# Altium footprint library FootprintsOld.PcbLib: 93 footprints (part 2 of 6)
Each footprint in its own frame and in the unit in brackets; x right, y up, seen from the top. Pads: shape width x height; smd on the part's side, far side on the other; paste and mask are expansions set on the pad; w line width, h text height; cw(c..) or ccw(c..) is an arc to the next point about the centre after c.
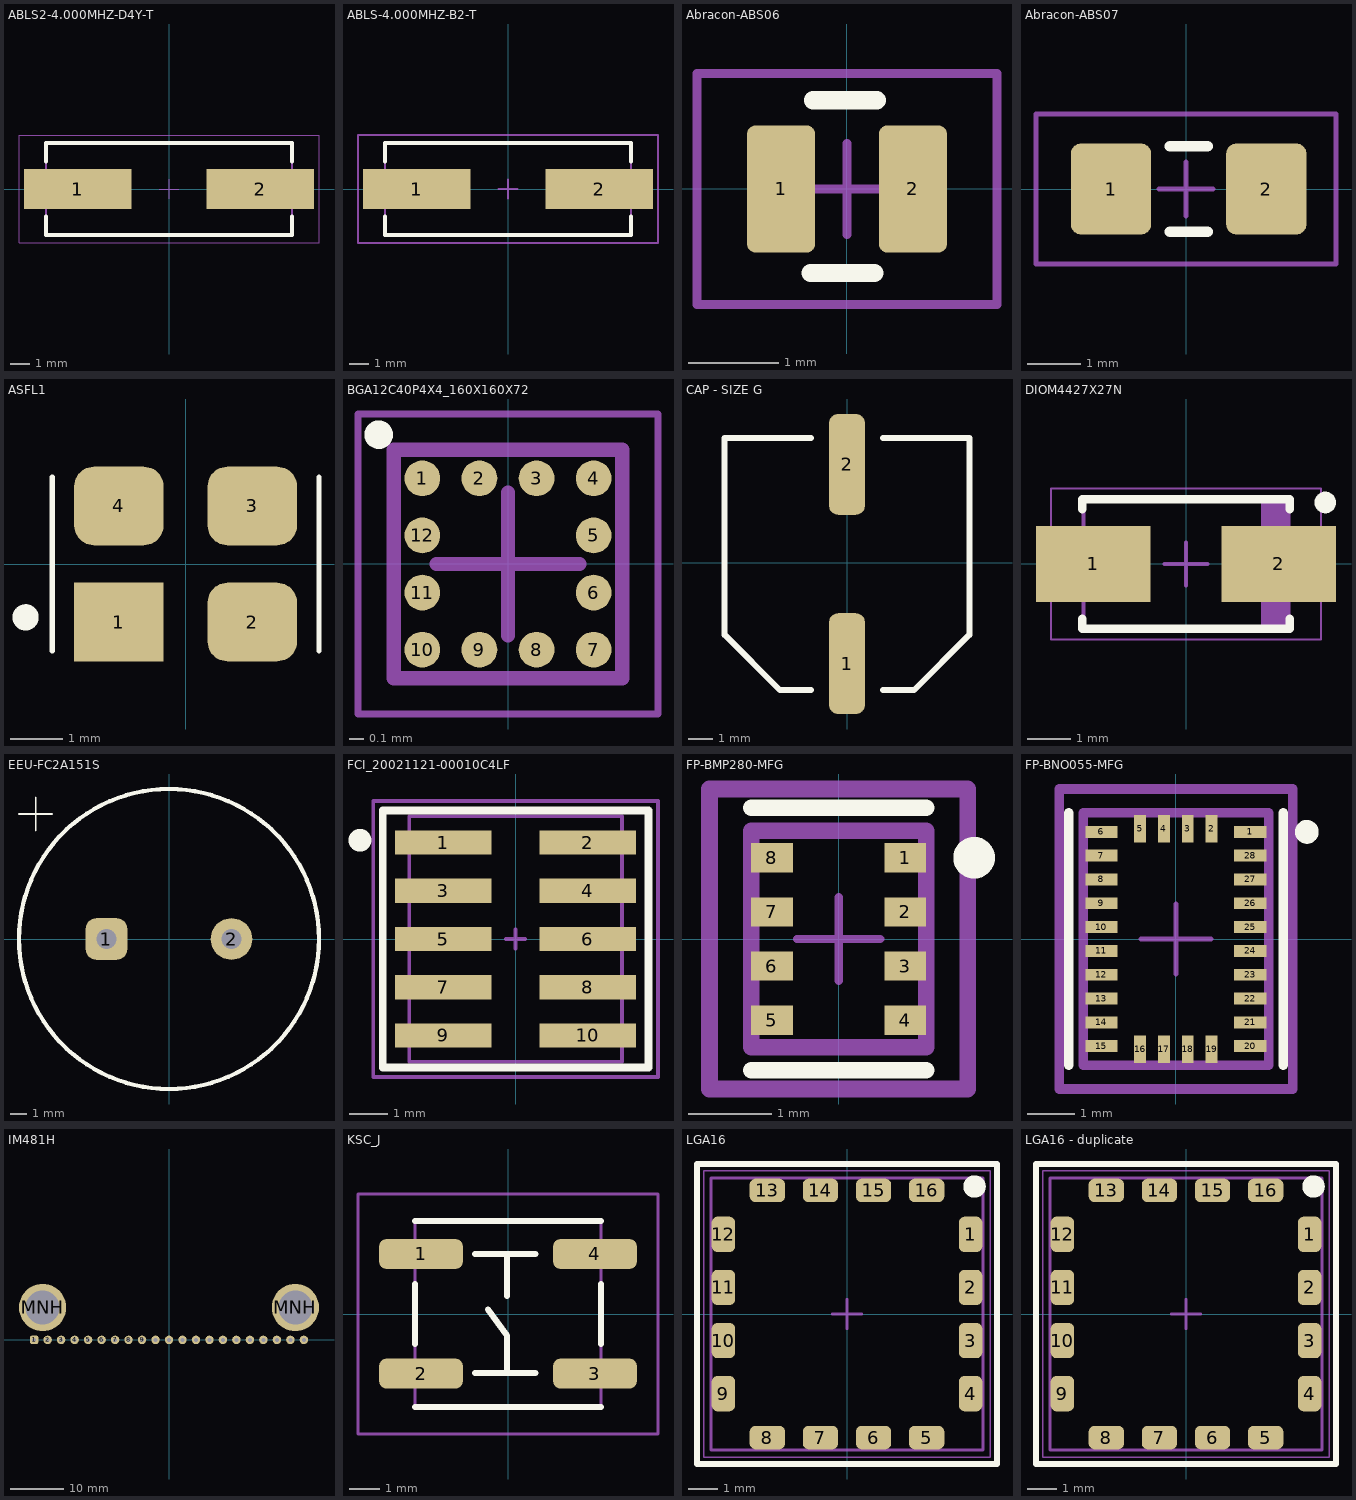
[diagram p1: the footprints below, top view; thin cyan lines are the x and y axes]

## ABLS2-4.000MHZ-D4Y-T [mm]
pads (2):
  rect 5.6x2.1 smd: 1(-4.75,0) 2(4.75,0)
Top Overlay:
  lines w0.2: -6.4,-1.425 -6.4,-2.4 6.4,-2.4 6.4,-1.425 ; -6.4,1.425 -6.4,2.4 6.4,2.4 6.4,1.425
Top Assembly (Mech13):
  lines w0.1: -6.4,-2.4 -6.4,2.4 6.4,2.4 6.4,-2.4 -6.4,-2.4
Top Courtyard:
  lines w0.05: -0.5,0 0.5,0 ; 0,-0.5 0,0.5 ; -7.8,-2.8 -7.8,2.8 7.8,2.8 7.8,-2.8 -7.8,-2.8
3D body "ABLS2.STEP": height 3.28, standoff 0.01, extent -6.35,-2.349 6.35,2.349

## ABLS-4.000MHZ-B2-T [mm]
pads (2):
  rect 5.6x2.1 smd: 1(-4.75,0) 2(4.75,0)
Top Overlay:
  lines w0.2: -6.4,-1.425 -6.4,-2.4 6.4,-2.4 6.4,-1.425 ; -6.4,1.425 -6.4,2.4 6.4,2.4 6.4,1.425
Top Assembly (Mech13):
  lines w0.1: -6.4,-2.4 6.4,-2.4 6.4,2.4 -6.4,2.4 -6.4,-2.4
Top Courtyard:
  lines w0.1: -0.5,0 0.5,0 ; 0,-0.5 0,0.5 ; -7.8,-2.8 7.8,-2.8 7.8,2.8 -7.8,2.8 -7.8,-2.8
3D body "ABLS-4.000MHZ-B2-T--3DModel-STEP-56544.STEP": height 4.08, standoff -0.15, extent -6.351,-2.413 6.4,2.413

## Abracon-ABS06 [mm] "Chip Inductor, 2-Leads, Body 3,2x1,5mm, IPC Low Density"
height 0.9
pads (2):
  rrect25% 0.75x1.4 smd: 1(-0.725,0) 2(0.725,0)
Top Overlay:
  lines w0.2: -0.4,-0.925 0.3,-0.925 ; -0.373,0.976 0.327,0.976
Top Courtyard:
  lines w0.1: -0.5,0 0.5,0 ; 0,-0.5 0,0.5 ; -1.651,-1.27 1.651,-1.27 1.651,1.27 -1.651,1.27 -1.651,-1.27
3D body "ABS06.STEP": height 0.62, standoff 0.01, extent -1.003,-0.597 1.003,0.597

## Abracon-ABS07 [mm] "Chip Inductor, 2-Leads, Body 3,2x1,5mm, IPC Low Density"
height 0.9
pads (2):
  rrect25% 1.5x1.7 smd: 1(-1.4,0) 2(1.5,0)
Top Overlay:
  lines w0.2: -0.3,-0.8 0.4,-0.8 ; -0.3,0.8 0.4,0.8
Top Courtyard:
  lines w0.1: -0.5,0 0.5,0 ; 0,-0.5 0,0.5 ; -2.8,-1.4 2.8,-1.4 2.8,1.4 -2.8,1.4 -2.8,-1.4
3D body "Abracom-ABS07.STEP": height 0.92, standoff 0.01, extent -1.61,-0.76 1.61,0.76

## ASFL1 [mil]
pads (4):
  rect 67x59 smd: 1(-50,-43.5)
  rrect50% 67x59 smd: 2(50,-43.5) 3(50,43.5) 4(-50,43.5)
Top Overlay:
  circle w9.84: c-119.92,-40 r4.92
  lines w3.94: -100,-65 -100,65 ; 100,-65 100,65
3D body "User Library-ASFL1.STEP": height 51.12, standoff -0.84, extent -97.35,-62.99 99.5,63

## BGA12C40P4X4_160X160X72 [mm] "BGA, 12-Leads, Body 1,60x1,60mmx0,72mm, Pitch 0,40mm"
height 0.72
pads (12):
  round 0.25 smd mask+0.04: 1(-0.6,0.6) 2(-0.2,0.6) 3(0.2,0.6) 4(0.6,0.6) 5(0.6,0.2) 6(0.6,-0.2) 7(0.6,-0.6) 8(0.2,-0.6) 9(-0.2,-0.6) 10(-0.6,-0.6) 11(-0.6,-0.2) 12(-0.6,0.2)
Top Overlay:
  circle w0.1: c-0.905,0.905 r0.05
Top Assembly:
  lines w0.1: -0.8,-0.8 -0.8,0.8 0.8,0.8 0.8,-0.8 -0.8,-0.8
Courtyard Top (Mech10):
  lines w0.05: -1.05,-1.05 -1.05,1.05 1.05,1.05 1.05,-1.05 -1.05,-1.05
  lines w0.1: -0.5,0 0.5,0 ; 0,-0.5 0,0.5
3D body "BGA12C40P4X4_160X160X72.step": height 0.72, standoff 0, extent -0.8,-0.8 0.8,0.8

## CAP - SIZE G [mm]
pads (2):
  rrect50% 1.5x4.2 smd: 1(0,-4.2) 2(0,4.1)
Top Overlay:
  lines w0.254: -1.5,-5.3 -2.8,-5.3 -5.1,-3 -5.1,5.2 -1.5,5.2 ; 1.5,-5.3 2.8,-5.3 5.1,-3 5.1,5.2 1.5,5.2
3D body "Capacitor G.STEP": height 10.31, standoff 0.09, extent -5.15,-5.8 5.15,5.8

## DIOM4427X27N [mm] "Molded Diode, 2-Leads, Body 4,38x2,73mm, IPC Medium Density"
height 2.7
pads (2):
  rect 2.65x1.75 smd: 1(-2.15,0) 2(2.15,0)
Top Overlay:
  circle w0.25: c3.225,1.425 r0.125
  lines w0.2: -2.4,-1.275 -2.4,-1.5 2.4,-1.5 2.4,-1.275 ; -2.4,1.275 -2.4,1.5 2.4,1.5 2.4,1.275
Top Assembly:
  rectangle: 1.736,-1.475 2.375,1.475
  lines w0.1: -2.375,-1.475 2.375,-1.475 2.375,1.475 -2.375,1.475 -2.375,-1.475
Courtyard Top (Mech10):
  lines w0.05: -3.125,-1.75 3.125,-1.75 3.125,1.75 -3.125,1.75 -3.125,-1.75
  lines w0.1: -0.5,0 0.5,0 ; 0,-0.5 0,0.5
3D body "DIOM4427X27N.step": height 2.7, standoff 0, extent -2.595,-1.475 2.595,1.475

## EEU-FC2A151S [mm] "CAP ALUM 18x15"
pads (2):
  rrect50% 2.5x2.5 hole 1.2: 1(-3.75,0)
  round 2.5 hole 1.2: 2(3.75,0)
Top Overlay:
  circle w0.254: c0,0 r9
  lines w0.1: -9,7.5 -7,7.5 ; -8,6.5 -8,8.5
3D body "User Library-panasonic eeufc1j681s.STEP": height 15.61, standoff -3.35, extent -9,-9 9,9

## FCI_20021121-00010C4LF [mm] "CONNECTOR, MICRO TERMINAL STRIP, 10POS, 2ROW, 1.27MM"
height 3.05
pads (10):
  rect 2.54x0.635 smd: 1(-1.905,2.54) 2(1.905,2.54) 3(-1.905,1.27) 4(1.905,1.27) 5(-1.905,0) 6(1.905,0) 7(-1.905,-1.27) 8(1.905,-1.27) 9(-1.905,-2.54) 10(1.905,-2.54)
Top Overlay:
  circle w0.5: c-4.1,2.6 r0.05
  lines w0.2: -3.5,-3.385 -3.5,3.385 3.5,3.385 3.5,-3.385 -3.5,-3.385
Top Assembly (Mech13):
  lines w0.1: -2.8,-3.235 -2.8,3.235 2.8,3.235 2.8,-3.235 -2.8,-3.235
Top Courtyard:
  lines w0.1: -0.25,0 0.25,0 ; 0,-0.25 0,0.25 ; -3.75,-3.635 -3.75,3.635 3.75,3.635 3.75,-3.635 -3.75,-3.635
3D body "20021121-00010XXLFc_HDR_SMD_5x2_50mil.stp": height 4.48, standoff -0.02, extent -2.75,-3.185 2.75,3.165

## FP-BMP280-MFG [mm]
pads (8):
  rect 0.5x0.35 smd paste+0 mask+0: 1(0.8,0.975) 2(0.8,0.325) 3(0.8,-0.325) 4(0.8,-0.975) 5(-0.8,-0.975) 6(-0.8,-0.325) 7(-0.8,0.325) 8(-0.8,0.975)
Top Overlay:
  circle w0.25: c1.625,0.975 r0.125
  lines w0.2: -1.05,-1.575 1.05,-1.575 ; -1.05,1.575 1.05,1.575
Courtyard Bottom:
  lines w0.2: -1.55,-1.8 -1.55,1.8 1.55,1.8 1.55,-1.8 -1.55,-1.8
  text ".Designator" at 0,0.188 h1
Top Assembly (Mech13):
  lines w0.2: -1.05,-1.3 -1.05,1.3 1.05,1.3 1.05,-1.3 -1.05,-1.3
Top Courtyard:
  lines w0.2: -1.55,-1.8 -1.55,1.8 1.55,1.8 1.55,-1.8 -1.55,-1.8
Mechanical 16:
  lines w0.1: -0.5,0 0.5,0 ; 0,-0.5 0,0.5
3D body "IC_Bosch_Sensortec_BMP280_eec.STEP": height 1, standoff 0, extent -1,-1.25 1,1.25

## FP-BNO055-MFG [mm]
pads (28):
  rect 0.675x0.25 smd paste+0 mask+0.05: 1(1.562,2.25) 6(-1.562,2.25) 7(-1.562,1.75) 8(-1.562,1.25) 9(-1.562,0.75) 10(-1.562,0.25) 11(-1.562,-0.25) 12(-1.562,-0.75) 13(-1.562,-1.25) 14(-1.562,-1.75) 15(-1.562,-2.25) 20(1.562,-2.25) 21(1.562,-1.75) 22(1.562,-1.25) 23(1.562,-0.75) 24(1.562,-0.25) 25(1.562,0.25) 26(1.562,0.75) 27(1.562,1.25) 28(1.562,1.75)
  rect 0.25x0.575 smd paste+0 mask+0.05: 2(0.75,2.312) 3(0.25,2.312) 4(-0.25,2.312) 5(-0.75,2.312) 16(-0.75,-2.312) 17(-0.25,-2.312) 18(0.25,-2.312) 19(0.75,-2.312)
Top Overlay:
  circle w0.25: c2.75,2.25 r0.125
  lines w0.2: -2.25,-2.65 -2.25,2.65 ; 2.25,-2.65 2.25,2.65
Courtyard Bottom:
  lines w0.2: -2.45,-3.15 2.45,-3.15 2.45,3.15 -2.45,3.15 -2.45,-3.15
  text ".Designator" at 0,-0.001 h1
Top Assembly (Mech13):
  lines w0.2: -1.95,-2.65 1.95,-2.65 1.95,2.65 -1.95,2.65 -1.95,-2.65
Top Courtyard:
  lines w0.1: -0.735,0 0.735,0 ; 0,-0.735 0,0.735
  lines w0.2: -2.45,-3.15 2.45,-3.15 2.45,3.15 -2.45,3.15 -2.45,-3.15
3D body "IC_Bosch_Sensortec_BNO055_eec.STEP": height 0.25, standoff 0, extent -2.45,-3.15 2.45,3.15

## IM481H [mm]
pads (23):
  rrect50% 1.6x1.6 hole 0.78: 1(-25.4,0)
  round 1.6 hole 0.78: 2(-22.86,0) 3(-20.32,0) 4(-17.78,0) 5(-15.24,0) 6(-12.7,0) 7(-10.16,0) 8(-7.62,0) 9(-5.08,0) 10(-2.54,0) 11(0,0) 12(2.54,0) 13(5.08,0) 14(7.62,0) 15(10.16,0) 16(12.7,0) 17(15.24,0) 18(17.78,0) 19(20.32,0) 20(22.86,0) 21(25.4,0)
  round 8.89 hole 6.35: MNH(-23.8,6.096) MNH(23.8,6.096)
3D body "Driver.STEP": height 27.91, standoff -4.39, extent -36.45,-3.048 36.45,34.752

## KSC_J [mm]
pads (4):
  rrect50% 2.8x1 smd: 1(-2.9,2) 2(-2.9,-1.988) 3(2.9,-1.988) 4(2.9,2)
Top Overlay:
  lines w0.2: -3.1,-3.1 3.1,-3.1 ; -3.1,-1 -3.1,1 ; -3.1,3.1 3.1,3.1 ; -1.095,-1.962 0.912,-1.962 ; -1.095,2 0.912,2 ; -0.663,0.146 -0.028,-0.718 -0.028,-1.912 ; -0.028,0.603 -0.028,2 ; 3.1,-1 3.1,1
Top Assembly (Mech13):
  lines w0.1: -3.1,-3.1 -3.1,0 -3.1,3.1 3.1,3.1 3.1,-3.1 -3.1,-3.1
Top Courtyard:
  lines w0.1: -5,-4 -5,4 5,4 5,-4 -5,-4
3D body "KSC223JLFG.stp": height 3.21, standoff -0.29, extent -3.4,-3.15 3.4,3.15

## LGA16 [mm] "LGA, 16-Leads, Body 9.20x9.20mmx3.90mm, Pitch 1.80mm"
height 3.9
pads (16):
  rrect50% 0.8x1.2 smd: 1(4.186,2.695) 2(4.186,0.898) 3(4.186,-0.899) 4(4.186,-2.696) 9(-4.186,-2.696) 10(-4.186,-0.899) 11(-4.186,0.898) 12(-4.186,2.695)
  rrect50% 1.2x0.8 smd: 5(2.696,-4.186) 6(0.899,-4.186) 7(-0.898,-4.186) 8(-2.695,-4.186) 13(-2.695,4.186) 14(-0.898,4.186) 15(0.899,4.186) 16(2.696,4.186)
Top Overlay:
  circle w0.25: c4.32,4.318 r0.256
  circle w0.25: c4.32,4.318 r0.125
  lines w0.2: -5.08,-5.08 5.08,-5.08 5.08,5.08 -5.08,5.08 -5.08,-5.08
Top Assembly (Mech13):
  lines w0.1: -4.6,-4.6 -4.6,4.6 4.6,4.6 4.6,-4.6 -4.6,-4.6
Top Courtyard:
  lines w0.05: -4.85,-4.85 -4.85,4.85 4.85,4.85 4.85,-4.85 -4.85,-4.85
  lines w0.1: -0.5,0 0.5,0 ; 0,-0.5 0,0.5
3D body "CC-16-2_ADI.step": height 3.91, standoff 0, extent -4.597,-4.674 4.597,4.674

## LGA16 - duplicate [mm] "LGA, 16-Leads, Body 9.20x9.20mmx3.90mm, Pitch 1.80mm"
height 3.9
pads (16):
  rrect50% 0.8x1.2 smd: 1(4.186,2.695) 2(4.186,0.898) 3(4.186,-0.899) 4(4.186,-2.696) 9(-4.186,-2.696) 10(-4.186,-0.899) 11(-4.186,0.898) 12(-4.186,2.695)
  rrect50% 1.2x0.8 smd: 5(2.696,-4.186) 6(0.899,-4.186) 7(-0.898,-4.186) 8(-2.695,-4.186) 13(-2.695,4.186) 14(-0.898,4.186) 15(0.899,4.186) 16(2.696,4.186)
Top Overlay:
  circle w0.25: c4.32,4.318 r0.256
  circle w0.25: c4.32,4.318 r0.125
  lines w0.2: -5.08,-5.08 5.08,-5.08 5.08,5.08 -5.08,5.08 -5.08,-5.08
Top Assembly (Mech13):
  lines w0.1: -4.6,-4.6 -4.6,4.6 4.6,4.6 4.6,-4.6 -4.6,-4.6
Top Courtyard:
  lines w0.05: -4.85,-4.85 -4.85,4.85 4.85,4.85 4.85,-4.85 -4.85,-4.85
  lines w0.1: -0.5,0 0.5,0 ; 0,-0.5 0,0.5
3D body "LGA_CC-16-2.step": height 3.91, standoff 0, extent -4.597,-4.674 4.597,4.674